# Altium footprint library Boards.PcbLib: 13 footprints
Each footprint in its own frame and in the unit in brackets; x right, y up, seen from the top. Pads: shape width x height; smd on the part's side, far side on the other; paste and mask are expansions set on the pad; w line width, h text height; cw(c..) or ccw(c..) is an arc to the next point about the centre after c.
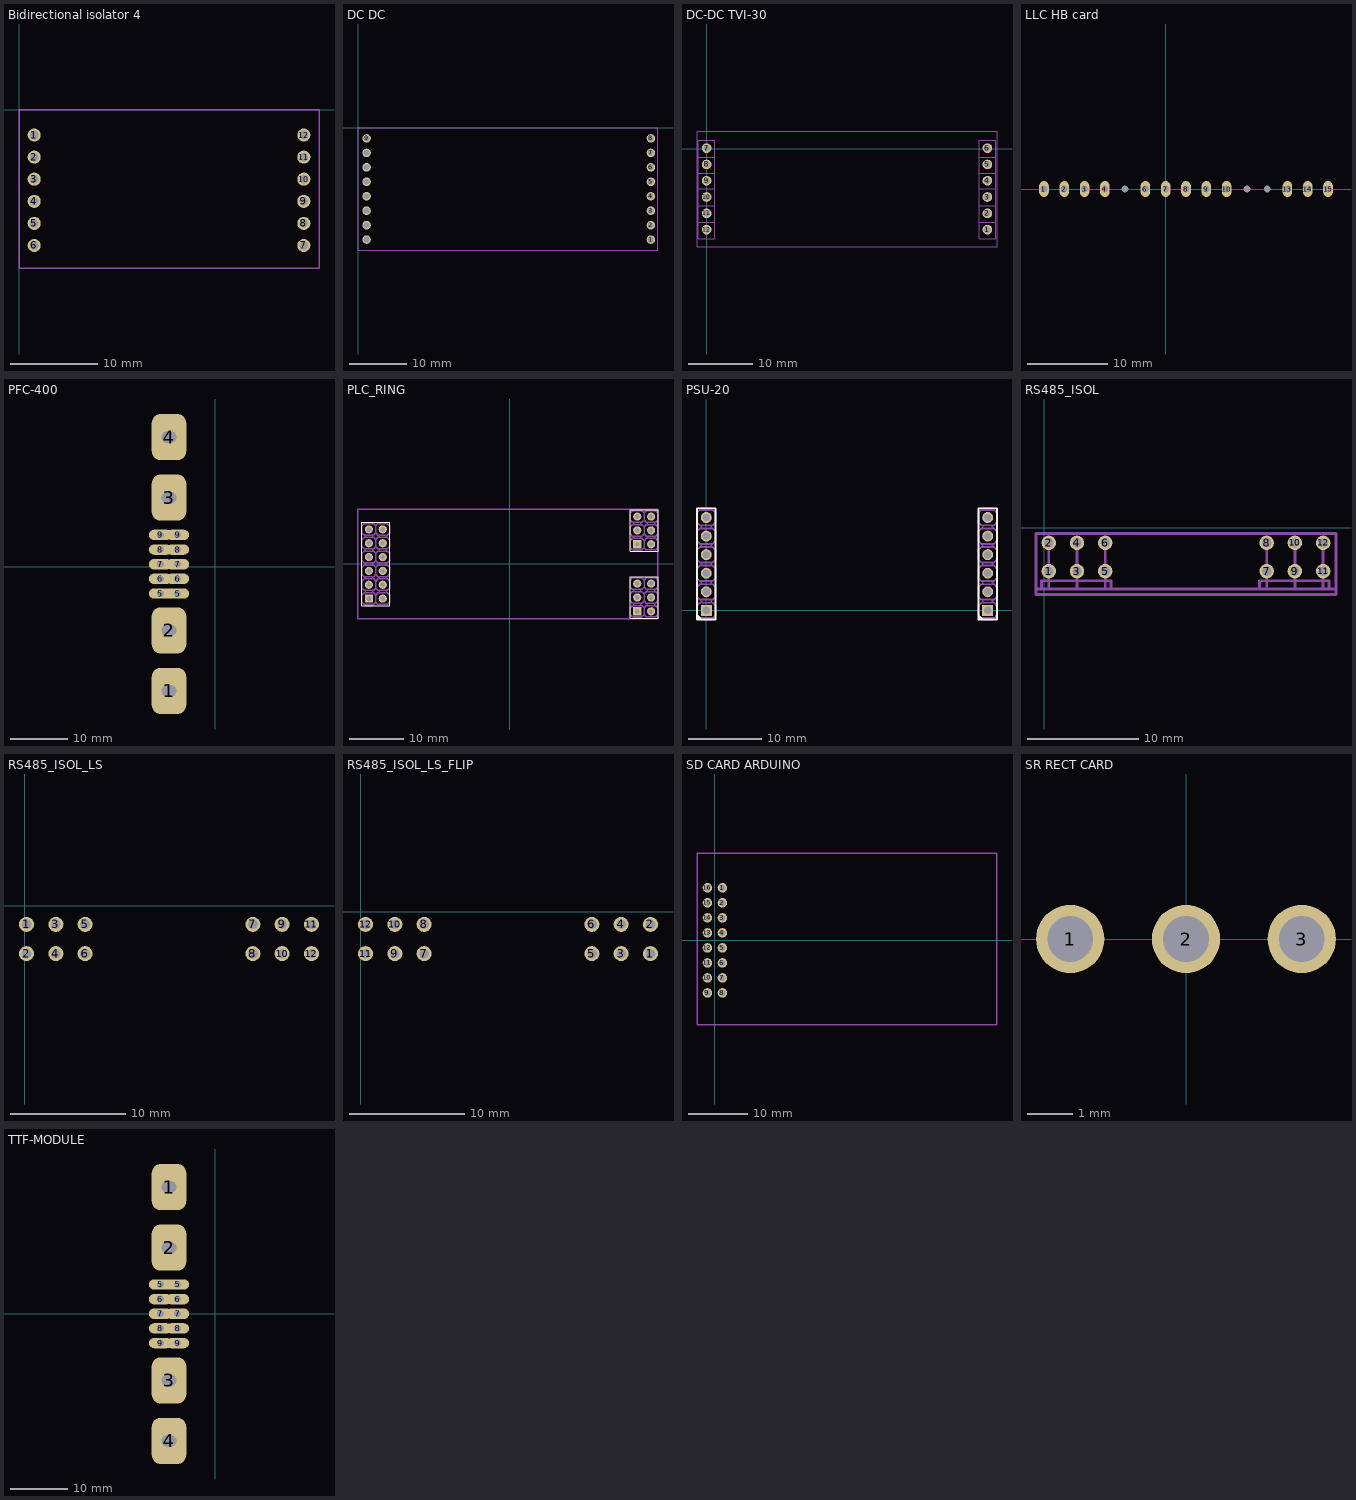
[diagram p0: the footprints below, top view; thin cyan lines are the x and y axes]

## Bidirectional isolator 4 [mm]
pads (12):
  round 1.5 hole 1: 1(1.75,-2.92) 2(1.75,-5.46) 3(1.75,-8) 4(1.75,-10.54) 5(1.75,-13.08) 6(1.75,-15.62) 7(32.75,-15.62) 8(32.75,-13.08) 9(32.75,-10.54) 10(32.75,-8) 11(32.75,-5.46) 12(32.75,-2.92)
Top Assembly (Mech13):
  lines w0.15: 0,-18.25 0,0 34.5,0 34.5,-18.25 0,-18.25
3D body "PCB1.step": height 8, standoff -3.54, extent 0,-18.5 34.5,-0.25

## DC DC [mm]
pads (16):
  round 1.5 hole 1: 1(51.5,-19.705) 2(51.5,-17.165) 3(51.5,-14.625) 4(51.5,-12.085) 5(51.5,-9.545) 6(51.5,-7.005) 7(51.5,-4.465) 8(51.5,-1.925) 9(1.5,-1.925) 10(1.5,-4.465) 11(1.5,-7.005) 12(1.5,-9.545) 13(1.5,-12.085) 14(1.5,-14.625) 15(1.5,-17.165) 16(1.5,-19.705)
Top Assembly (Mech13):
  lines w0.102: 0,-21.625 26.375,-21.625 52.75,-21.625 52.75,0 0,0 0,-21.625
3D body "DC-DC.step": height 2.5, standoff -18.91, extent 0.113,-21.5 52.887,2

## DC-DC TVI-30 [mm]
pads (12):
  round 1.5 hole 1: 1(43.754,-12.58) 2(43.754,-10.04) 3(43.754,-7.5) 4(43.754,-4.96) 5(43.754,-2.42) 6(43.754,0.12) 7(0,0.12) 8(0,-2.42) 9(0,-4.96) 10(0,-7.5) 11(0,-10.04) 12(0,-12.58)
Top Assembly (Mech13):
  lines w0.15: -1.274,-11.43 1.266,-11.43 ; -1.274,-1.27 1.266,-1.27 ; -1.27,-8.89 1.27,-8.89 ; -1.27,-6.25 1.27,-6.25 ; -1.27,-3.81 1.27,-3.81 ; 42.48,-11.43 45.02,-11.43 ; 42.48,-1.27 45.02,-1.27 ; 42.484,-8.89 45.024,-8.89 ; 42.484,-6.25 45.024,-6.25 ; 42.484,-3.81 45.024,-3.81 ; -1.5,-15.25 45.25,-15.25 45.25,2.75 -1.5,2.75 -1.5,-15.25 ; -1.274,-14 1.266,-14 1.266,1.376 -1.274,1.376 -1.274,-14 ; 42.48,-14 45.02,-14 45.02,1.376 42.48,1.376 42.48,-14
3D body "DC-DC.step": height 18.8, standoff -0.95, extent -1.5,-15.25 45.25,2.75

## LLC HB card [mm]
pads (15):
  oval 1.2x2 hole 0.85: 1(-15.24,0) 2(-12.7,0) 3(-10.16,0) 4(-7.62,0) 6(-2.54,0) 7(0,0) 8(2.54,0) 9(5.08,0) 10(7.62,0) 13(15.24,0) 14(17.78,0) 15(20.32,0)
  round 0 hole 0.85: 5(-5.08,0) 11(10.16,0) 12(12.7,0)
3D body: height 7, standoff -7.79, extent -15.24,5.08 -15.24,5.08
3D body "UCC25630 card.step": height 27, standoff -5.54, extent -16.529,-4.3 21.6,6.075

## PFC-400 [mm]
pads (14):
  rrect50% 6x8 hole 2 slot 2.5 at 0 deg: 1(-8,-21.5) 2(-8,-11) 3(-8,12) 4(-8,22.5)
  oval 4x1.8 hole 1.2: 5(-9.5,-4.62) 5(-6.5,-4.62) 6(-9.5,-2.08) 6(-6.5,-2.08) 7(-9.5,0.46) 7(-6.5,0.46) 8(-9.5,3) 8(-6.5,3) 9(-9.5,5.54) 9(-6.5,5.54)
Mechanical 2:
  lines w0.15: -10,-5.22 cw(c-10,-4.62) -10.6,-4.62 cw(c-10,-4.62) -10,-4.02 ; -10,-5.22 -9,-5.22 ; -10,-5.22 -9,-5.22 ; -10,-4.02 -9,-4.02 ; -10,-4.02 -9,-4.02 ; -10,-2.68 cw(c-10,-2.08) -10.6,-2.08 cw(c-10,-2.08) -10,-1.48 ; -10,-2.68 -9,-2.68 ; -10,-2.68 -9,-2.68 ; -10,-1.48 -9,-1.48 ; -10,-1.48 -9,-1.48 ; -10,-0.14 cw(c-10,0.46) -10.6,0.46 cw(c-10,0.46) -10,1.06 ; -10,-0.14 -9,-0.14 ; -10,-0.14 -9,-0.14 ; -10,1.06 -9,1.06 ; -10,1.06 -9,1.06 ; -10,2.4 cw(c-10,3) -10.6,3 cw(c-10,3) -10,3.6 ; -10,2.4 -9,2.4 ; -10,2.4 -9,2.4 ; -10,3.6 -9,3.6 ; -10,3.6 -9,3.6 ; -10,4.94 cw(c-10,5.54) -10.6,5.54 cw(c-10,5.54) -10,6.14 ; -10,4.94 -9,4.94 ; -10,4.94 -9,4.94 ; -10,6.14 -9,6.14 ; -10,6.14 -9,6.14 ; -9,-5.22 ccw(c-9,-4.62) -8.4,-4.62 ccw(c-9,-4.62) -9,-4.02 ; -9,-2.68 ccw(c-9,-2.08) -8.4,-2.08 ccw(c-9,-2.08) -9,-1.48 ; -9,-0.14 ccw(c-9,0.46) -8.4,0.46 ccw(c-9,0.46) -9,1.06 ; -9,2.4 ccw(c-9,3) -8.4,3 ccw(c-9,3) -9,3.6 ; -9,4.94 ccw(c-9,5.54) -8.4,5.54 ccw(c-9,5.54) -9,6.14 ; -7,-5.22 cw(c-7,-4.62) -7.6,-4.62 cw(c-7,-4.62) -7,-4.02 ; -7,-5.22 -6,-5.22 ; -7,-5.22 -6,-5.22 ; -7,-4.02 -6,-4.02 ; -7,-4.02 -6,-4.02 ; -7,-2.68 cw(c-7,-2.08) -7.6,-2.08 cw(c-7,-2.08) -7,-1.48 ; -7,-2.68 -6,-2.68 ; -7,-2.68 -6,-2.68 ; -7,-1.48 -6,-1.48 ; -7,-1.48 -6,-1.48 ; -7,-0.14 cw(c-7,0.46) -7.6,0.46 cw(c-7,0.46) -7,1.06 ; -7,-0.14 -6,-0.14 ; -7,-0.14 -6,-0.14 ; -7,1.06 -6,1.06 ; -7,1.06 -6,1.06 ; -7,2.4 cw(c-7,3) -7.6,3 cw(c-7,3) -7,3.6 ; -7,2.4 -6,2.4 ; -7,2.4 -6,2.4 ; -7,3.6 -6,3.6 ; -7,3.6 -6,3.6 ; -7,4.94 cw(c-7,5.54) -7.6,5.54 cw(c-7,5.54) -7,6.14 ; -7,4.94 -6,4.94 ; -7,4.94 -6,4.94 ; -7,6.14 -6,6.14 ; -7,6.14 -6,6.14 ; -6,-5.22 ccw(c-6,-4.62) -5.4,-4.62 ccw(c-6,-4.62) -6,-4.02 ; -6,-2.68 ccw(c-6,-2.08) -5.4,-2.08 ccw(c-6,-2.08) -6,-1.48 ; -6,-0.14 ccw(c-6,0.46) -5.4,0.46 ccw(c-6,0.46) -6,1.06 ; -6,2.4 ccw(c-6,3) -5.4,3 ccw(c-6,3) -6,3.6 ; -6,4.94 ccw(c-6,5.54) -5.4,5.54 ccw(c-6,5.54) -6,6.14 ; -9.5,-24.75 ccw(c-9,-24.75) -9,-25.25 -7,-25.25 ccw(c-7,-24.75) -6.5,-24.75 -6.5,-21.5 -6.5,-18.25 ccw(c-7,-18.25) -7,-17.75 -9,-17.75 ccw(c-9,-18.25) -9.5,-18.25 -9.5,-21.5 -9.5,-24.75 ; -9.5,-14.25 ccw(c-9,-14.25) -9,-14.75 -7,-14.75 ccw(c-7,-14.25) -6.5,-14.25 -6.5,-11 -6.5,-7.75 ccw(c-7,-7.75) -7,-7.25 -9,-7.25 ccw(c-9,-7.75) -9.5,-7.75 -9.5,-11 -9.5,-14.25 ; -9.5,8.75 ccw(c-9,8.75) -9,8.25 -7,8.25 ccw(c-7,8.75) -6.5,8.75 -6.5,12 -6.5,15.25 ccw(c-7,15.25) -7,15.75 -9,15.75 ccw(c-9,15.25) -9.5,15.25 -9.5,12 -9.5,8.75 ; -9.5,19.25 ccw(c-9,19.25) -9,18.75 -7,18.75 ccw(c-7,19.25) -6.5,19.25 -6.5,22.5 -6.5,25.75 ccw(c-7,25.75) -7,26.25 -9,26.25 ccw(c-9,25.75) -9.5,25.75 -9.5,22.5 -9.5,19.25
3D body "Main.step": height 40, standoff -6.04, extent -11,-24.54 11.911,25.46

## PLC_RING [mm]
pads (24):
  rect 1.5x1.5 hole 0.9: X1_1(23.33,3.61) X2_1(-25.87,-6.36) X3_1(23.33,-8.69)
  round 1.5 hole 0.9: X1_2(25.87,3.61) X1_3(23.33,6.15) X1_4(25.87,6.15) X1_5(23.33,8.69) X1_6(25.87,8.69) X2_2(-23.33,-6.36) X2_3(-25.87,-3.82) X2_4(-23.33,-3.82) X2_5(-25.87,-1.28) X2_6(-23.33,-1.28) X2_7(-25.87,1.26) X2_8(-23.33,1.26) X2_9(-25.87,3.8) X2_10(-23.33,3.8) X2_11(-25.87,6.34) X2_12(-23.33,6.34) X3_2(25.87,-8.69) X3_3(23.33,-6.15) X3_4(25.87,-6.15) X3_5(23.33,-3.61) X3_6(25.87,-3.61)
Top Overlay:
  lines w0.2: 22.06,-5.092 22.06,-9.96 ; 22.06,7.208 22.06,2.34 ; 22.06,-9.96 27.14,-9.96 27.14,-2.34 22.06,-2.34 22.06,-9.96 ; 22.06,2.34 27.14,2.34 27.14,9.96 22.06,9.96 22.06,2.34 ; -27.14,-7.63 -22.06,-7.63 -22.06,7.61 -27.14,7.61 -27.14,-7.63
Top Assembly (Mech13):
  drawing of 517 lines, arcs and shapes, not listed
3D body "PLC_ModuleV0.0.1.step": height 14.87, standoff -3.39, extent -27.9,-10 27.12,10

## PSU-20 [mm]
pads (12):
  rect 1.5x1.5 hole 1: X1_1(38.5,0) X2_1(0,0)
  round 1.5 hole 1: X1_2(38.5,2.54) X1_3(38.5,5.08) X1_4(38.5,7.62) X1_5(38.5,10.16) X1_6(38.5,12.7) X2_2(0,2.54) X2_3(0,5.08) X2_4(0,7.62) X2_5(0,10.16) X2_6(0,12.7)
Top Overlay:
  region: -0.5,-1.27 -1.27,-0.5 -1.27,-1.27
  region: 38,-1.27 37.23,-0.5 37.23,-1.27
  lines w0.254: -1.27,-1.27 -1.27,13.97 1.27,13.97 1.27,-1.27 -1.27,-1.27 ; 37.23,-1.27 37.23,13.97 39.77,13.97 39.77,-1.27 37.23,-1.27
Top Assembly (Mech13):
  drawing of 272 lines, arcs and shapes, not listed
3D body "PSU-20.step": height 13, standoff -4.95, extent -1.47,-2.46 40.03,15.44

## RS485_ISOL [mm]
pads (12):
  round 1.3 hole 0.85: 1(0.4,-3.89) 2(0.4,-1.35) 3(2.94,-3.89) 4(2.94,-1.35) 5(5.48,-3.89) 6(5.48,-1.35) 7(20.01,-3.89) 8(20.01,-1.35) 9(22.55,-3.89) 10(22.55,-1.35) 11(25.09,-3.89) 12(25.09,-1.35)
Top Assembly (Mech13):
  lines w0.25: -0.75,-5.5 26.25,-5.5 ; -0.25,-5.5 -0.25,-4.75 0.4,-4.75 5.48,-4.75 6,-4.75 6,-5.5 ; 0.4,-5.5 0.4,-2 ; 2.94,-5.5 2.94,-2 ; 5.48,-5.5 5.48,-2 ; 19.36,-5.5 19.36,-4.75 20.01,-4.75 25.09,-4.75 25.61,-4.75 25.61,-5.5 ; 20.01,-5.5 20.01,-2 ; 22.55,-5.5 22.55,-2 ; 25.09,-5.5 25.09,-2 ; -0.75,-6 -0.75,-0.5 26.25,-0.5 26.25,-6 -0.75,-6
3D body "RS485_ISOL.step": height 23.25, standoff -2.89, extent -0.865,-8.2 26.365,6

## RS485_ISOL_LS [mm]
pads (12):
  round 1.3 hole 0.85: 1(0.15,-1.61) 2(0.15,-4.15) 3(2.69,-1.61) 4(2.69,-4.15) 5(5.23,-1.61) 6(5.23,-4.15) 7(19.76,-1.61) 8(19.76,-4.15) 9(22.3,-1.61) 10(22.3,-4.15) 11(24.84,-1.61) 12(24.84,-4.15)
3D body "1.step": height 15.2, standoff -3.91, extent -1.115,-17.8 26.115,0

## RS485_ISOL_LS_FLIP [mm]
pads (12):
  round 1.3 hole 0.85: 1(25.1,-3.64) 2(25.1,-1.1) 3(22.56,-3.64) 4(22.56,-1.1) 5(20.02,-3.64) 6(20.02,-1.1) 7(5.49,-3.64) 8(5.49,-1.1) 9(2.95,-3.64) 10(2.95,-1.1) 11(0.41,-3.64) 12(0.41,-1.1)
3D body "1.step": height 14.2, standoff -4.91, extent -0.865,-17.05 26.365,0.75

## SD CARD ARDUINO [mm]
pads (16):
  round 1.6 hole 1: 1(1.27,8.89) 2(1.27,6.35) 3(1.27,3.81) 4(1.27,1.27) 5(1.27,-1.27) 6(1.27,-3.81) 7(1.27,-6.35) 8(1.27,-8.89) 9(-1.27,-8.89) 10(-1.27,-6.35) 11(-1.27,-3.81) 12(-1.27,-1.27) 13(-1.27,1.27) 14(-1.27,3.81) 15(-1.27,6.35) 16(-1.27,8.89)
Top Assembly (Mech13):
  lines w0.25: -3.03,-14.27 -3.03,14.73 47.72,14.73 47.72,-14.27 -3.03,-14.27
3D body "User Library-ArduinoSDCardModule1.step": height 7, standoff -5.5, extent -3.073,-14.469 47.506,14.531

## SR RECT CARD [mm]
pads (3):
  round 1.5 hole 1: 1(-2.54,0) 2(0,0) 3(2.54,0)
3D body "NCP4308.step": height 31.78, standoff -4.04, extent -6.25,-4.3 7.276,6.075

## TTF-MODULE [mm]
pads (14):
  rrect50% 6x8 hole 2 slot 2.5 at 0 deg: 1(-8,21.96) 2(-8,11.46) 3(-8,-11.54) 4(-8,-22.04)
  oval 4x1.8 hole 1.2: 5(-9.5,5.08) 5(-6.5,5.08) 6(-9.5,2.54) 6(-6.5,2.54) 7(-9.5,0) 7(-6.5,0) 8(-9.5,-2.54) 8(-6.5,-2.54) 9(-9.5,-5.08) 9(-6.5,-5.08)
Mechanical 2:
  lines w0.15: -10,-5.68 cw(c-10,-5.08) -10.6,-5.08 cw(c-10,-5.08) -10,-4.48 ; -10,-5.68 -9,-5.68 ; -10,-5.68 -9,-5.68 ; -10,-4.48 -9,-4.48 ; -10,-4.48 -9,-4.48 ; -10,-3.14 cw(c-10,-2.54) -10.6,-2.54 cw(c-10,-2.54) -10,-1.94 ; -10,-3.14 -9,-3.14 ; -10,-3.14 -9,-3.14 ; -10,-1.94 -9,-1.94 ; -10,-1.94 -9,-1.94 ; -10,-0.6 cw(c-10,0) -10.6,0 cw(c-10,0) -10,0.6 ; -10,-0.6 -9,-0.6 ; -10,-0.6 -9,-0.6 ; -10,0.6 -9,0.6 ; -10,0.6 -9,0.6 ; -10,1.94 cw(c-10,2.54) -10.6,2.54 cw(c-10,2.54) -10,3.14 ; -10,1.94 -9,1.94 ; -10,1.94 -9,1.94 ; -10,3.14 -9,3.14 ; -10,3.14 -9,3.14 ; -10,4.48 cw(c-10,5.08) -10.6,5.08 cw(c-10,5.08) -10,5.68 ; -10,4.48 -9,4.48 ; -10,4.48 -9,4.48 ; -10,5.68 -9,5.68 ; -10,5.68 -9,5.68 ; -9,-5.68 ccw(c-9,-5.08) -8.4,-5.08 ccw(c-9,-5.08) -9,-4.48 ; -9,-3.14 ccw(c-9,-2.54) -8.4,-2.54 ccw(c-9,-2.54) -9,-1.94 ; -9,-0.6 ccw(c-9,0) -8.4,0 ccw(c-9,0) -9,0.6 ; -9,1.94 ccw(c-9,2.54) -8.4,2.54 ccw(c-9,2.54) -9,3.14 ; -9,4.48 ccw(c-9,5.08) -8.4,5.08 ccw(c-9,5.08) -9,5.68 ; -7,-5.68 cw(c-7,-5.08) -7.6,-5.08 cw(c-7,-5.08) -7,-4.48 ; -7,-5.68 -6,-5.68 ; -7,-5.68 -6,-5.68 ; -7,-4.48 -6,-4.48 ; -7,-4.48 -6,-4.48 ; -7,-3.14 cw(c-7,-2.54) -7.6,-2.54 cw(c-7,-2.54) -7,-1.94 ; -7,-3.14 -6,-3.14 ; -7,-3.14 -6,-3.14 ; -7,-1.94 -6,-1.94 ; -7,-1.94 -6,-1.94 ; -7,-0.6 cw(c-7,0) -7.6,0 cw(c-7,0) -7,0.6 ; -7,-0.6 -6,-0.6 ; -7,-0.6 -6,-0.6 ; -7,0.6 -6,0.6 ; -7,0.6 -6,0.6 ; -7,1.94 cw(c-7,2.54) -7.6,2.54 cw(c-7,2.54) -7,3.14 ; -7,1.94 -6,1.94 ; -7,1.94 -6,1.94 ; -7,3.14 -6,3.14 ; -7,3.14 -6,3.14 ; -7,4.48 cw(c-7,5.08) -7.6,5.08 cw(c-7,5.08) -7,5.68 ; -7,4.48 -6,4.48 ; -7,4.48 -6,4.48 ; -7,5.68 -6,5.68 ; -7,5.68 -6,5.68 ; -6,-5.68 ccw(c-6,-5.08) -5.4,-5.08 ccw(c-6,-5.08) -6,-4.48 ; -6,-3.14 ccw(c-6,-2.54) -5.4,-2.54 ccw(c-6,-2.54) -6,-1.94 ; -6,-0.6 ccw(c-6,0) -5.4,0 ccw(c-6,0) -6,0.6 ; -6,1.94 ccw(c-6,2.54) -5.4,2.54 ccw(c-6,2.54) -6,3.14 ; -6,4.48 ccw(c-6,5.08) -5.4,5.08 ccw(c-6,5.08) -6,5.68 ; -9.5,-25.29 ccw(c-9,-25.29) -9,-25.79 -7,-25.79 ccw(c-7,-25.29) -6.5,-25.29 -6.5,-22.04 -6.5,-18.79 ccw(c-7,-18.79) -7,-18.29 -9,-18.29 ccw(c-9,-18.79) -9.5,-18.79 -9.5,-22.04 -9.5,-25.29 ; -9.5,-14.79 ccw(c-9,-14.79) -9,-15.29 -7,-15.29 ccw(c-7,-14.79) -6.5,-14.79 -6.5,-11.54 -6.5,-8.29 ccw(c-7,-8.29) -7,-7.79 -9,-7.79 ccw(c-9,-8.29) -9.5,-8.29 -9.5,-11.54 -9.5,-14.79 ; -9.5,8.21 ccw(c-9,8.21) -9,7.71 -7,7.71 ccw(c-7,8.21) -6.5,8.21 -6.5,11.46 -6.5,14.71 ccw(c-7,14.71) -7,15.21 -9,15.21 ccw(c-9,14.71) -9.5,14.71 -9.5,11.46 -9.5,8.21 ; -9.5,18.71 ccw(c-9,18.71) -9,18.21 -7,18.21 ccw(c-7,18.71) -6.5,18.71 -6.5,21.96 -6.5,25.21 ccw(c-7,25.21) -7,25.71 -9,25.71 ccw(c-9,25.21) -9.5,25.21 -9.5,21.96 -9.5,18.71
3D body "MosfetModule.step": height 40, standoff -6.04, extent -18.162,-25 -5.25,25